# Altium integrated library Connector.IntLib: 213 symbols (part 2 of 2)
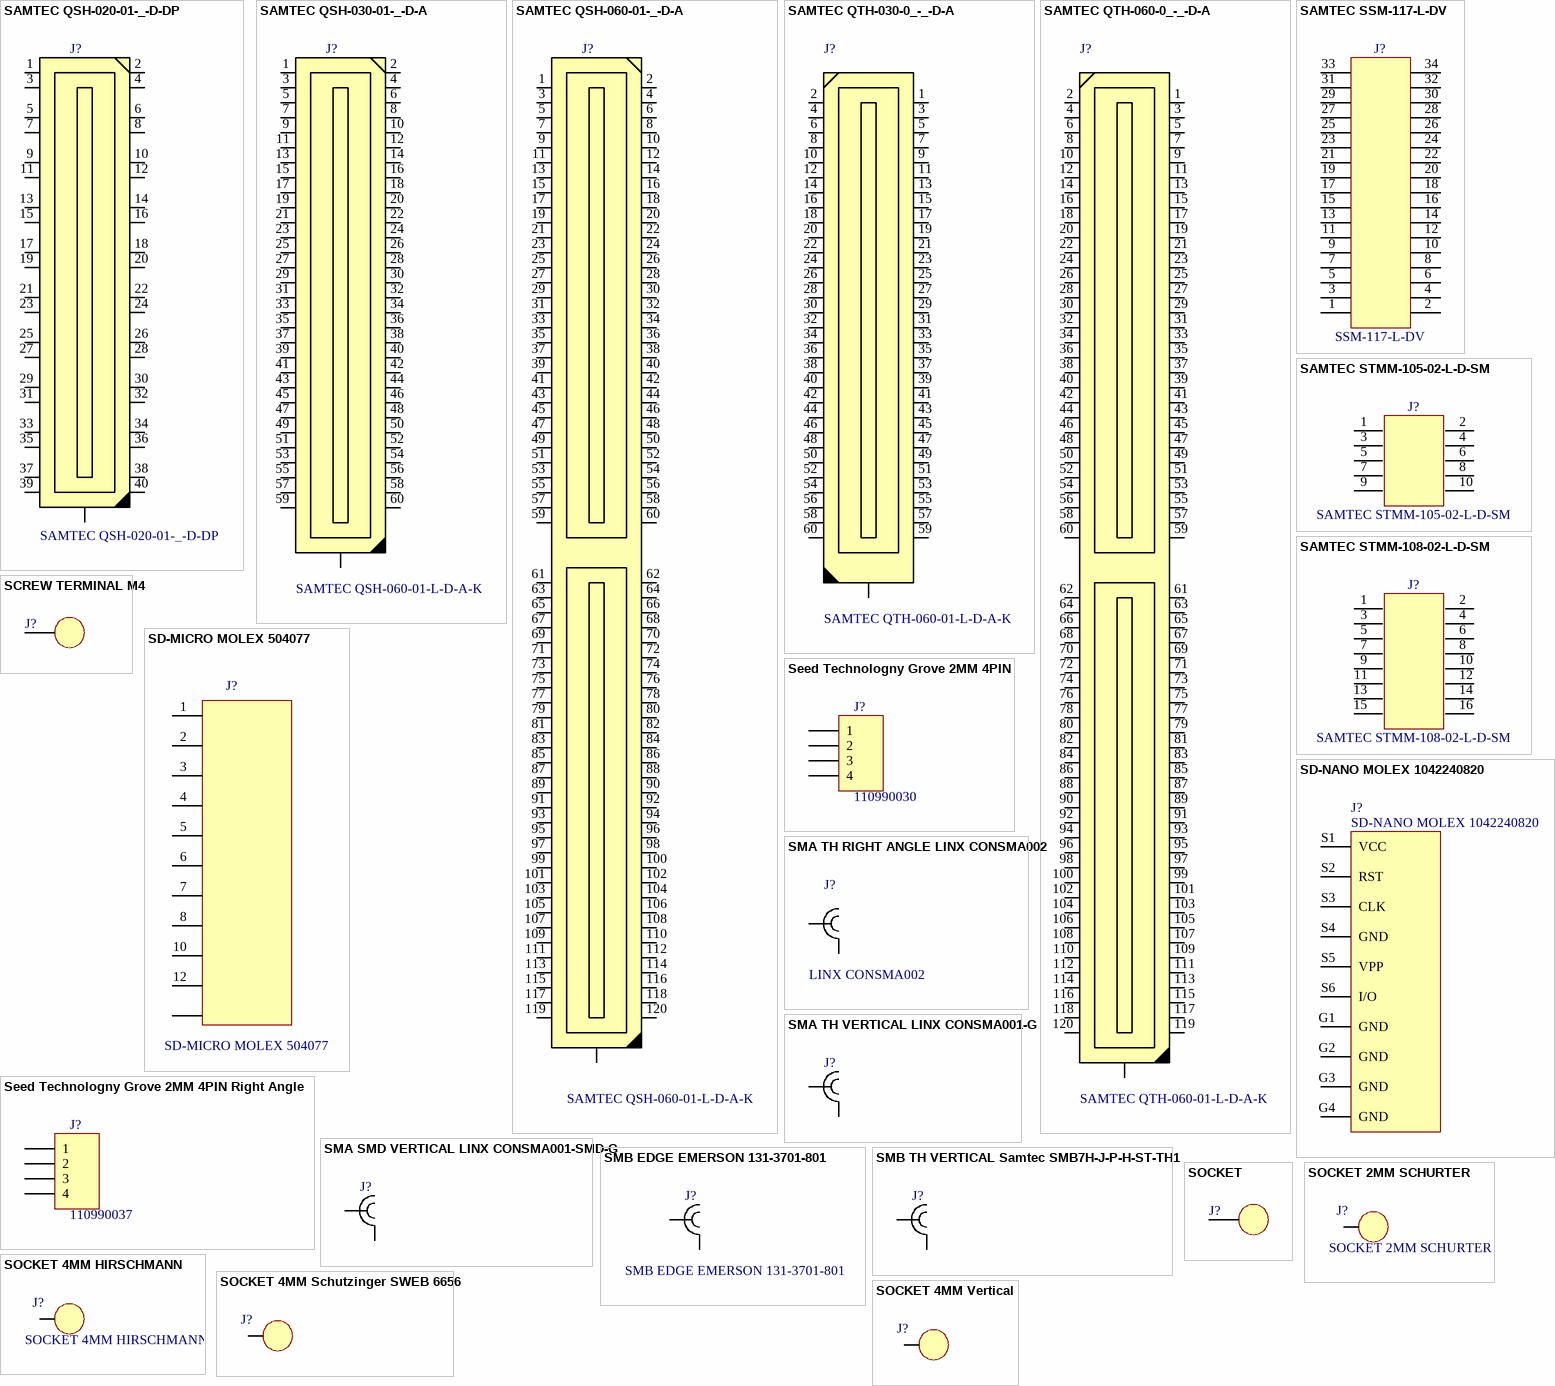
[diagram p9: symbols SAMTEC QSH-020-01-_-D-DP to SOCKET 4MM Vertical]

## SOCKET 4MM Schutzinger SWEB 6656
designator J?, comment SOCKET 4MM  (value not drawn)
SOCKET 4MM Schutzinger SWEB 6656; Value: *
footprint SOCKET 4MM Schutzinger SWEB 6656 Black (SOCKET 4MM Schutzinger Black)
footprint SOCKET 4MM Schutzinger SWEB 6656 Blue (SOCKET 4MM Schutzinger Blue)
footprint SOCKET 4MM Schutzinger SWEB 6656 Red (SOCKET 4MM Schutzinger Red)
footprint SOCKET 4MM Schutzinger SWEB 6656 Yellow (SOCKET 4MM Schutzinger Black)
pins: 1

## SOCKET 4MM Vertical
designator J?  (value not drawn)
footprint SOCKET 4MM VERTICAL
pins: 1

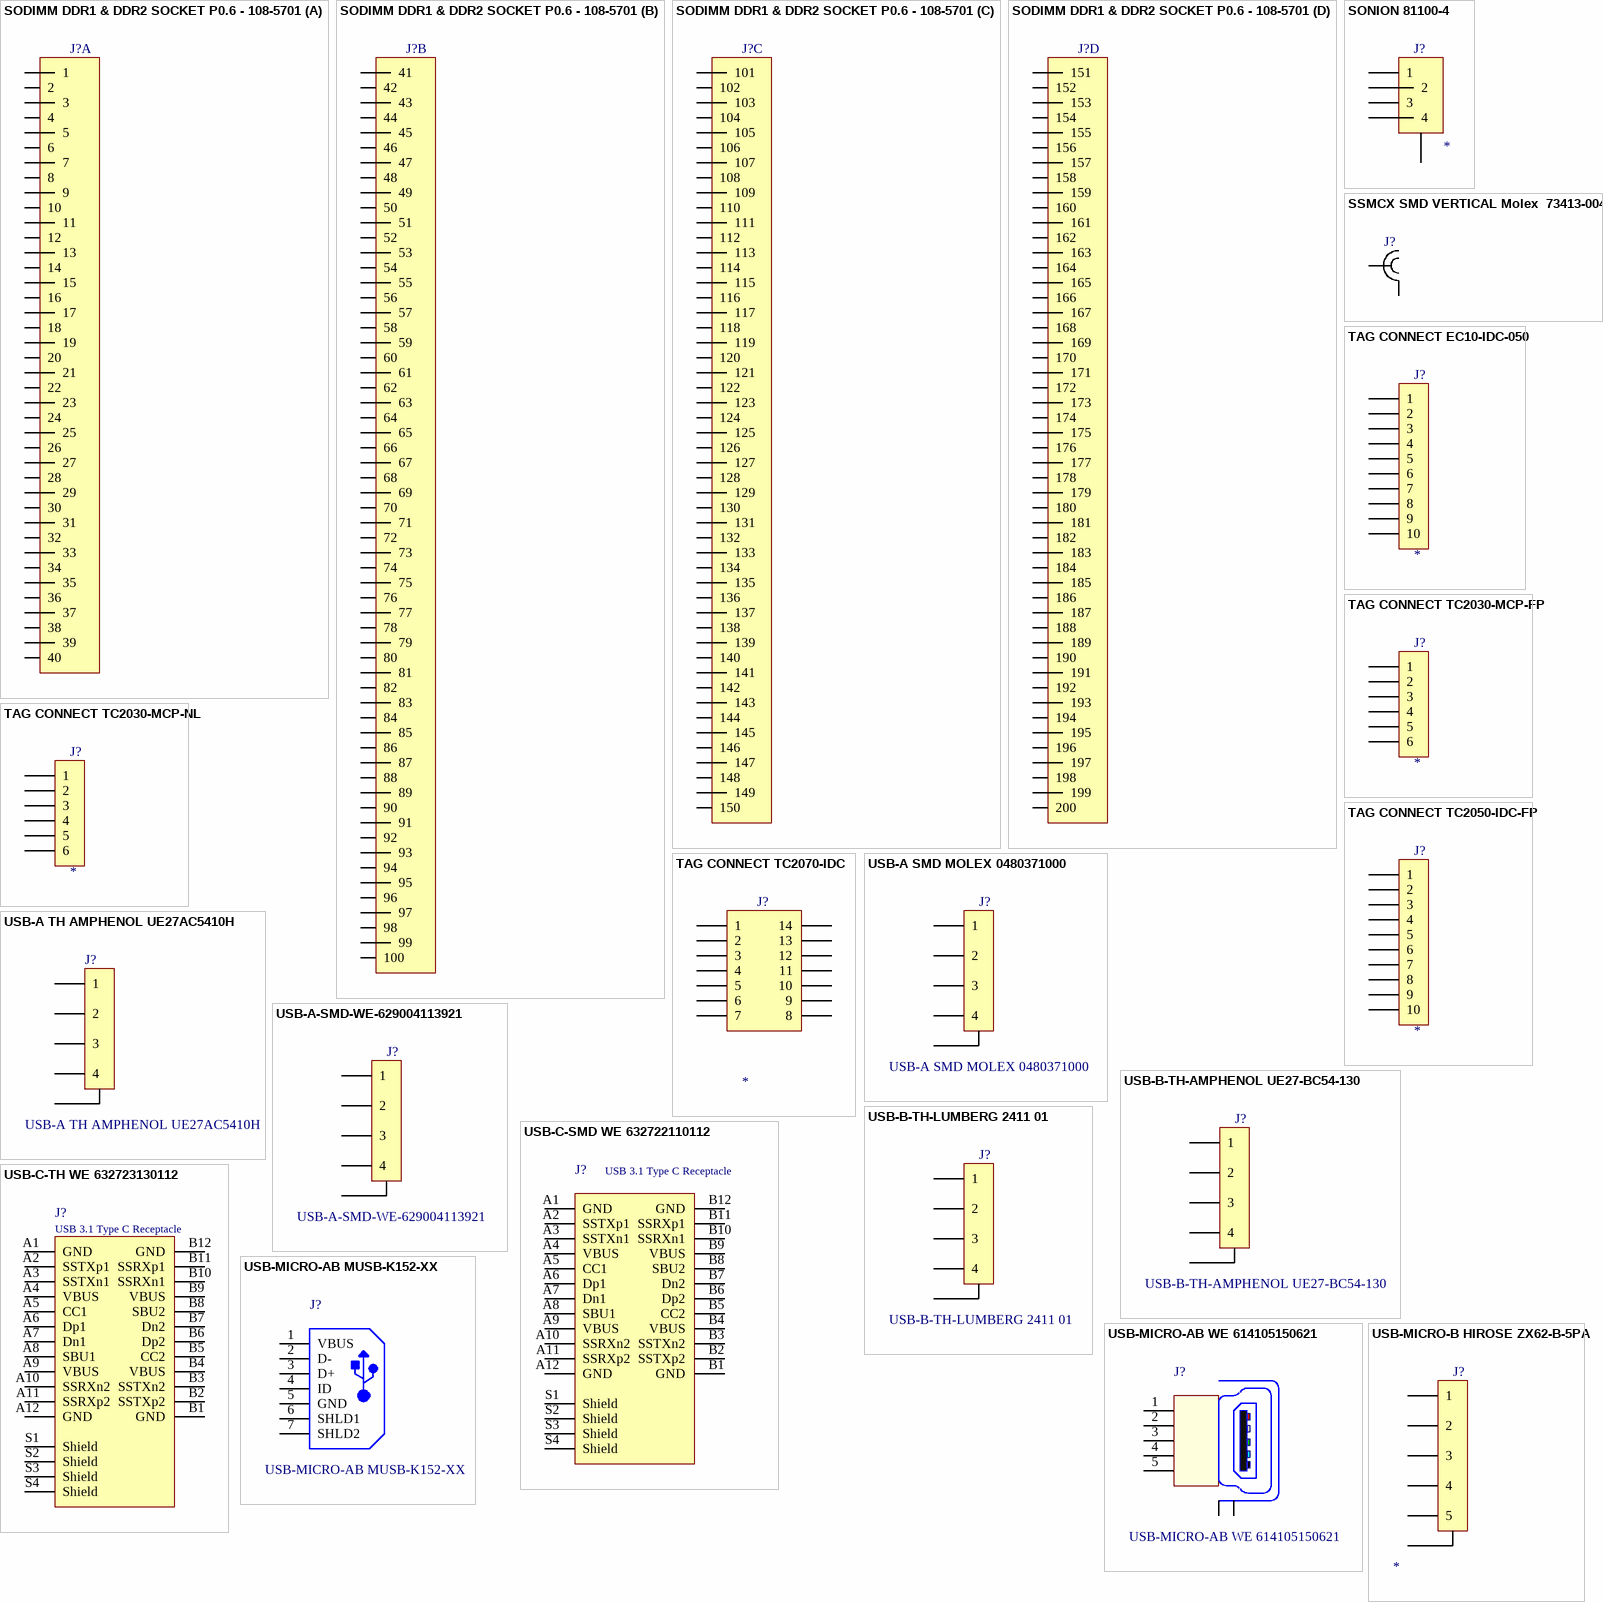
[diagram p7: symbols SODIMM DDR1 & DDR2 SOCKET P0.6 - 108-5701 to USB-MICRO-B HIROSE ZX62-B-5PA]

## SODIMM DDR1 & DDR2 SOCKET P0.6 - 108-5701
designator J?  (value not drawn)
SODIMM 200P DDR1 & DDR2
footprint SODIMM 200P DDR1 & DDR2 (SODIMM DDR1 & DDR2 SOCKET P0.6 - 108-5701)
part A pins: 1, 2, 3, 4, 5, 6, 7, 8, 9, 10, 11, 12, 13, 14, 15, 16, 17, 18, 19, 20, 21, 22, 23, 24, 25, 26, 27, 28, 29, 30, 31, 32, 33, 34, 35, 36, 37, 38, 39, 40
part B pins: 41, 42, 43, 44, 45, 46, 47, 48, 49, 50, 51, 52, 53, 54, 55, 56, 57, 58, 59, 60, 61, 62, 63, 64, 65, 66, 67, 68, 69, 70, 71, 72, 73, 74, 75, 76, 77, 78, 79, 80, 81, 82, 83, 84, 85, 86, 87, 88, 89, 90, 91, 92, 93, 94, 95, 96, 97, 98, 99, 100
part C pins: 101, 102, 103, 104, 105, 106, 107, 108, 109, 110, 111, 112, 113, 114, 115, 116, 117, 118, 119, 120, 121, 122, 123, 124, 125, 126, 127, 128, 129, 130, 131, 132, 133, 134, 135, 136, 137, 138, 139, 140, 141, 142, 143, 144, 145, 146, 147, 148, 149, 150
part D pins: 151, 152, 153, 154, 155, 156, 157, 158, 159, 160, 161, 162, 163, 164, 165, 166, 167, 168, 169, 170, 171, 172, 173, 174, 175, 176, 177, 178, 179, 180, 181, 182, 183, 184, 185, 186, 187, 188, 189, 190, 191, 192, 193, 194, 195, 196, 197, 198, 199, 200

## SONION 81100-4
designator J?
PowerDin 4 poles
footprint SONION 81100-4 (PowerDin 4 poles)
pins: 1, 2, 3, 4, 5

## SSMCX SMD VERTICAL Molex  73413-004
designator J?, comment 73413-004  (value not drawn)
SSMCX SMD VERTICAL Molex  73413-004; Value: 73413-004
footprint SSMCX SMD VERTICAL Molex  73413-004
pins: 1, 2

## TAG CONNECT EC10-IDC-050
designator J?
TAG CONNECT EC10-IDC-050
footprint Tag Connect EC10-IDC-050
pins: 1, 2, 3, 4, 5, 6, 7, 8, 9, 10

## TAG CONNECT TC2030-MCP-FP
designator J?
TAG CONNECT TC2030-MCP-FP
footprint TAG CONNECT TC2030-MCP-FP
pins: 1, 2, 3, 4, 5, 6

## TAG CONNECT TC2030-MCP-NL
designator J?
TAG CONNECT TC2030-MCP-NL
footprint TAG CONNECT TC2030-MCP-NL
pins: 1, 2, 3, 4, 5, 6

## TAG CONNECT TC2050-IDC-FP
designator J?
TAG CONNECT TC2050-IDC-FP
footprint Tag Connect TC2050-IDC-FP
pins: 1, 2, 3, 4, 5, 6, 7, 8, 9, 10

## TAG CONNECT TC2070-IDC
designator J?
TAG CONNECT TC2070-IDC
footprint TAG CONNECT TC2070-IDC
pins: 1, 2, 3, 4, 5, 6, 7, 8, 9, 10, 11, 12, 13, 14

## USB-A SMD MOLEX 0480371000
designator J?
footprint USB-A SMD MOLEX 0480371000 (Connector USB-A MOLEX nr. 0480371000)
pins: 1, 2, 3, 4, 5, 6

## USB-A TH AMPHENOL UE27AC5410H
designator J?
footprint USB-A TH AMPHENOL UE27AC5410H
pins: 1, 2, 3, 4, 5, 6

## USB-A-SMD-WE-629004113921
designator J?
footprint USB-A SMD WE 629004113921 (Connector USB-A Wurth Electronik nr. 629004113921)
pins: 1, 2, 3, 4, 5, 6

## USB-B-TH-AMPHENOL UE27-BC54-130
designator J?
footprint USB-B TH AMPHENOL UE27-BC54-130
pins: 1, 2, 3, 4, 5, 6

## USB-B-TH-LUMBERG 2411 01
designator J?
footprint USB-B-TH-LUMBERG 2411 01
pins: 1, 2, 3, 4, 5

## USB-C-SMD WE 632722110112
designator J?, comment USB 3.1 Type C Receptacle
USB 3.1 Type C, Receptacle, Vertical, SMT; Part Number: 632722110112; Rated Current: 5A; Pin Number: 24; Interface Type: Type C; Working Voltage: 20VAC; ComponentLink1Description: Manufacturer; ComponentLink1URL: http://www.we-online.de; ComponentLink2Description: Datasheet; ComponentLink2URL: https://katalog.we-online.com/em/datasheet/632722110112.pdf; Published Date: September 2019; Publisher: Wurth Elektronik; Gender: Receptacle; Type: Vertical; Packaging: Tape and Reel; Operating Temperature: -40 to +85degC; Mounting Technology: SMT; Application: USB 3.1
footprint USB-C-SMD WE 632722110112 (USB_Type C 3.1_Vertical_SMT_1,0mm)
pins: A1 GND, A2 SSTXp1, A3 SSTXn1, A4 VBUS, A5 CC1, A6 Dp1, A7 Dn1, A8 SBU1, A9 VBUS, A10 SSRXn2, A11 SSRXp2, A12 GND, B1 GND, B2 SSTXp2, B3 SSTXn2, B4 VBUS, B5 CC2, B6 Dp2, B7 Dn2, B8 SBU2, B9 VBUS, B10 SSRXn1, B11 SSRXp1, B12 GND, S1 Shield, S2 Shield, S3 Shield, S4 Shield

## USB-C-TH WE 632723130112
designator J?, comment USB 3.1 Type C Receptacle
USB 3.1 Type C, Receptacle, Horizontal, THR; Part Number: 632723130112; Rated Current: 5A; Pin Number: 24; Interface Type: Type C; Working Voltage: 20VAC; ComponentLink1Description: Manufacturer; ComponentLink1URL: http://www.we-online.de; ComponentLink2Description: Datasheet; ComponentLink2URL: https://katalog.we-online.com/em/datasheet/632723130112.pdf; Published Date: September 2019; Publisher: Wurth Elektronik; Gender: Receptacle; Type: Horizontal; Packaging: Tape and Reel; Operating Temperature: -40 to +85degC; Mounting Technology: THR; Application: USB 3.1
footprint USB-C-TH WE 632723130112 (Footprint not found)
pins: A1 GND, A2 SSTXp1, A3 SSTXn1, A4 VBUS, A5 CC1, A6 Dp1, A7 Dn1, A8 SBU1, A9 VBUS, A10 SSRXn2, A11 SSRXp2, A12 GND, B1 GND, B2 SSTXp2, B3 SSTXn2, B4 VBUS, B5 CC2, B6 Dp2, B7 Dn2, B8 SBU2, B9 VBUS, B10 SSRXn1, B11 SSRXp1, B12 GND, S1 Shield, S2 Shield, S3 Shield, S4 Shield

## USB-MICRO-AB MUSB-K152-XX
designator J?
MICRO-AB USB RECEPTACLE, RIGHT ANGLE PCB MOUNT; Manufacturer: Amphenol Canada Corp.; ComponentLink1 Description: Manufacturer; ComponentLink2 Description: Datasheet; NoPins: 7; ComponentLink1URL: https://www.amphenolcanada.com; ComponentLink2URL: https://www.amphenolcanada.com/ProductSearch/drawings/AC/MUSBK152XX.pdf; Created by: arc; Created Date: 28.09.2017; partNo: MUSB-K152-XX
footprint USB-MICRO-AB MUSB-K152-XX (TH, 5-Leads, Body 20.25x10.68mm)
pins: 1 VBUS, 2 D-, 3 D+, 4 ID, 5 GND, 6 SHLD1, 7 SHLD2

## USB-MICRO-AB WE 614105150621
designator J?
WR-COM_USB_Micro Type AB_Vertical_THT; Manufacturer: Würth Elektronik eiSos GmbH; ComponentLink1 Description: Manufacturer; ComponentLink2 Description: Datasheet; NoPins: 5; ComponentLink1URL: http://www.we-online.de; ComponentLink2URL: http://katalog.we-online.de/em/datasheet/614105150621.pdf; Created by: Karrer Zheng; Created Date: 10/24/2014; partNo: 614105150621
footprint USB-MICRO-AB-WE-614105150621 (WR-COM_USB_Micro Type AB_Vertical_THT Micro Type AB Vertical THT)
pins: 1 VCC, 2 D-, 3 D+, 4 ID, 5 GND, Z1 Shield, Z2 Shield

## USB-MICRO-B HIROSE ZX62-B-5PA
designator J?
USB-MICRO-B HIROSE ZX62-B-5PA; Value: *
footprint USB-MICRO-B HIROSE ZX62-B-5PA (USB-MICRO-B HIROSE SMT, 5-Leads, Body 7.9x5mm, Pitch 0.65mm)
pins: 1, 2, 3, 4, 5, 6, 7, 8, 9, 10, 11

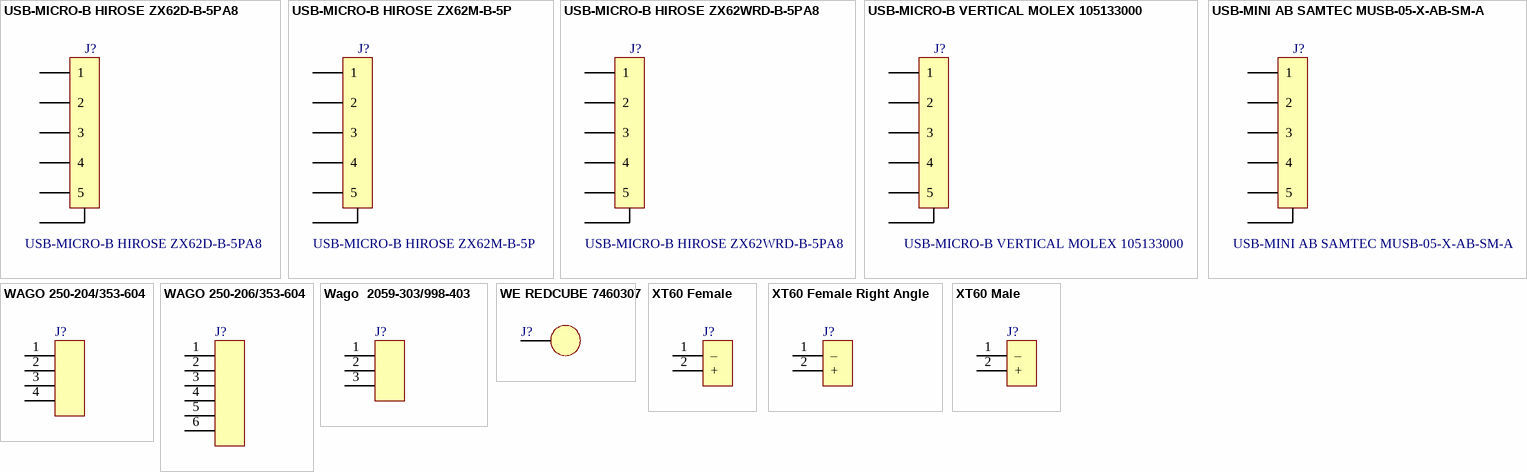
[diagram p8: symbols USB-MICRO-B HIROSE ZX62D-B-5PA8 to XT60 Male]

## USB-MICRO-B HIROSE ZX62D-B-5PA8
designator J?
footprint USB-MICRO-B HIROSE ZX62D-B-5PA8 (USB-MICRO-B HIROSE nr. ZX62D-B-5PA8)
pins: 1, 2, 3, 4, 5, 6, 7, 8, 9

## USB-MICRO-B HIROSE ZX62M-B-5P
designator J?
footprint USB-MICRO-B HIROSE ZX62M-B-5P (USB-MICRO-B HIROSE SMT, ZX62M-B-5P)
pins: 1, 2, 3, 4, 5, 6

## USB-MICRO-B HIROSE ZX62WRD-B-5PA8
designator J?
footprint USB-MICRO-B HIROSE ZX62WRD-B-5PA8 (USB-MICRO-B HIROSE nr. ZX62WRD-B-5PA8)
pins: 1, 2, 3, 4, 5, 6, 7, 8, 9

## USB-MICRO-B VERTICAL MOLEX 105133000
designator J?
Value: USB-MICRO-B VERTICAL MOLEX 105133000
footprint USB-MICRO-B VERTICAL MOLEX 1051330001
pins: 1, 2, 3, 4, 5, 6

## USB-MINI AB SAMTEC MUSB-05-X-AB-SM-A
designator J?
footprint USB-Mini-AB SAMTEC MUSB-05-_-AB-SM-A (Connector USB Mini AB SAMTEC nr. MUSB-05-_-AB-SM-A)
pins: 1, 2, 3, 4, 5, 6, 7, 8, 9, 10 hidden, 11 hidden

## WAGO 250-204/353-604
designator J?, comment Wago 2059-303/998-403  (value not drawn)
Borne pour circuits imprimés THR; Bouton-poussoir; 1,5 mm²; Pas 3,5 mm; 4  pôles; Push-in CAGE CLAMP®; 1,50 mm²; noir; Value: Wago 2059-303/998-403
footprint WAGO 250-204/353-604 (Borne pour circuits imprimés THR; Bouton-poussoir; 1,5 mm²; Pas 3,5 mm; 4  pôles; Push-in CAGE CLAMP®; 1,50 mm²; noir)
pins: 1, 2, 3, 4

## WAGO 250-206/353-604
designator J?, comment Wago 2059-303/998-403  (value not drawn)
Borne pour circuits imprimés THR; Bouton-poussoir; 1,5 mm²; Pas 3,5 mm; 6  pôles; Push-in CAGE CLAMP®; 1,50 mm²; noir; Value: Wago 2059-303/998-403
footprint WAGO 250-206/353-604 (Borne pour circuits imprimés THR; Bouton-poussoir; 1,5 mm²; Pas 3,5 mm; 4  pôles; Push-in CAGE CLAMP®; 1,50 mm²; noir)
pins: 1, 2, 3, 4, 5, 6

## Wago  2059-303/998-403
designator J?, comment Wago 2059-303/998-403  (value not drawn)
3 Position PCB Wire Holder; Value: Wago 2059-303/998-403
footprint Wago 2059-303/998-403 (3 Position PCB Wire Holder)
pins: 1, 2, 3

## WE REDCUBE 7460307
designator J?  (value not drawn)
REDCUBE PRESS-FIT 7460307; Value: *
footprint WE REDCUBE 7460307 (REDCUBE PRESS-FIT 7460307)
pins: 1 M4, 2, 3, 4, 5, 6, 7, 8

## XT60 Female
designator J?  (value not drawn)
XT60 Female, Vertical pcb mount; Value: XT60 Female
footprint XT60 Female (XT60 Female, Vertical pcb mount)
pins: 1 –, 2 +

## XT60 Female Right Angle
designator J?, comment XT60 Female  (value not drawn)
XT60 Female,Right Angle pcb mount; Value: XT60 Female
footprint XT60 PW-F (XT60 Female, Right angle pcb mount)
pins: 1 –, 2 +

## XT60 Male
designator J?  (value not drawn)
XT60 Male, Vertical pcb mount; Value: XT60 Male
footprint XT60 Male (XT60 Male, Vertical pcb mount)
pins: 1 –, 2 +